# Altium footprint library Amirreza.PcbLib: 524 footprints (part 5 of 33)
Each footprint in its own frame and in the unit in brackets; x right, y up, seen from the top. Pads: shape width x height; smd on the part's side, far side on the other; paste and mask are expansions set on the pad; w line width, h text height; cw(c..) or ccw(c..) is an arc to the next point about the centre after c.
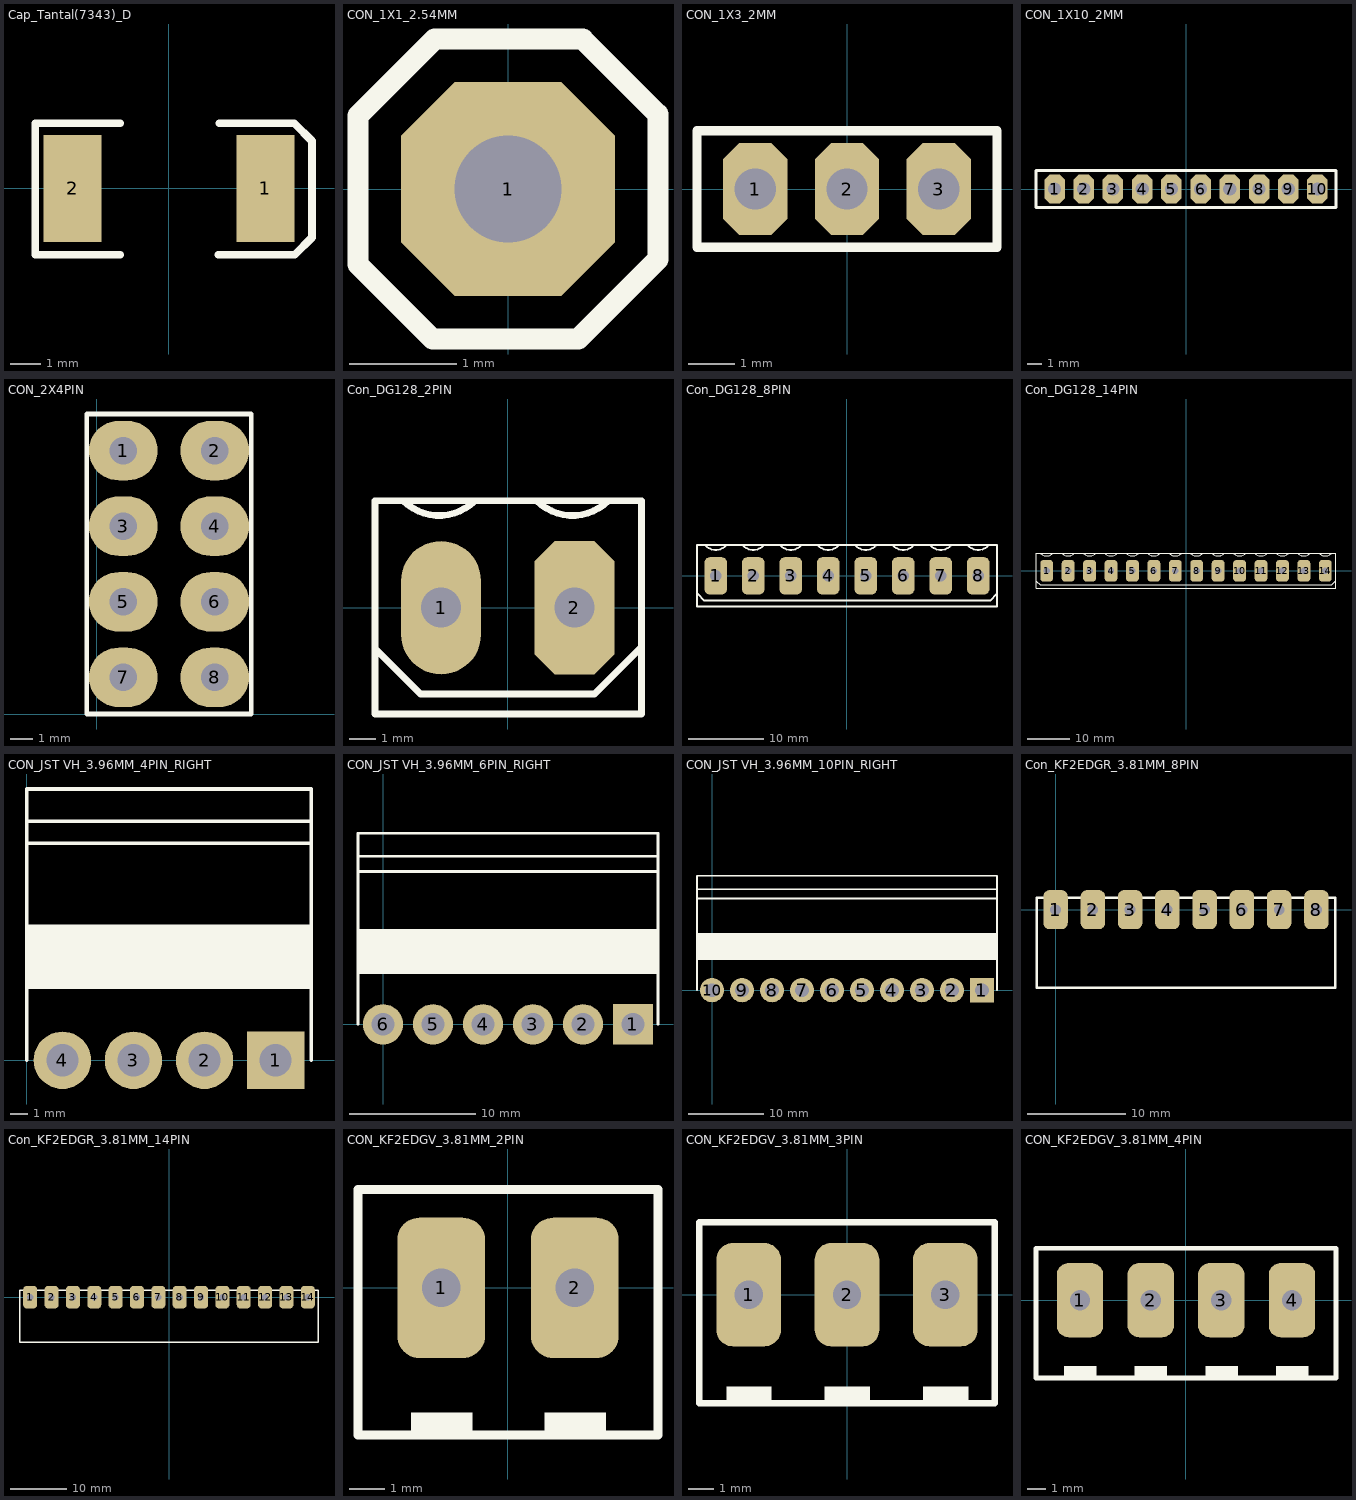
[diagram p4: the footprints below, top view; thin cyan lines are the x and y axes]

## Cap_Tantal(7343)_D [mm]
pads (2):
  rect 1.9x3.5 smd: 1(3.15,0) 2(-3.15,0)
Top Overlay:
  lines w0.254: -1.601,-2.166 -4.369,-2.166 -4.369,2.134 -1.601,2.134 ; 1.618,-2.166 4.107,-2.166 4.673,-1.6 4.673,1.549 4.089,2.134 1.651,2.134
3D body "User Library-AVX_E_CASE.step": height 4.2, standoff 0, extent -3.7,-2.225 3.7,2.225

## CON_1X1_2.54MM [mm]
pads (1):
  oct 2x2 hole 1: 1(0,0)
Top Overlay:
  lines w0.2: -1.4,-0.704 -1.4,0.685 -0.685,1.4 0.696,1.4 1.4,0.696 1.4,-0.656 0.656,-1.4 -0.704,-1.4 -1.4,-0.704
3D body "User Library-Header Vertical 2_54mm Pitch2-1.step": height 5.99, standoff -2.89, extent -1.27,-1.27 1.27,1.27

## CON_1X3_2MM [mm]
pads (3):
  oct 1.4x2 hole 0.9: 1(-2,0) 2(0,0) 3(2,0)
Top Overlay:
  lines w0.2: -3.27,-1.27 -3.27,1.27 -1.365,1.27 3.27,1.27 3.27,-1.27 -3.27,-1.27

## CON_1X10_2MM [mm]
pads (10):
  oct 1.4x2 hole 0.9: 1(-9,0) 2(-7,0) 3(-5,0) 4(-3,0) 5(-1,0) 6(1,0) 7(3,0) 8(5,0) 9(7,0) 10(9,0)
Top Overlay:
  lines w0.2: -10.27,-1.27 10.27,-1.27 10.27,1.27 -8.365,1.27 -10.27,1.27 -10.27,-1.27

## CON_2X4PIN [mm]
pads (8):
  oval 3x2.6 hole 1.2: 1(1.15,11.5) 2(5.15,11.5) 3(1.15,8.2) 4(5.15,8.2) 5(1.15,4.9) 6(5.15,4.9) 7(1.15,1.6) 8(5.15,1.6)
Top Overlay:
  lines w0.2: -0.45,13.075 -0.45,0 6.75,0 6.75,13.075 ; -0.45,13.1 6.75,13.1

## Con_DG128_2PIN [mm]
pads (2):
  oval 3x5 hole 1.5: 1(-2.5,0)
  oct 3x5 hole 1.5: 2(2.5,0)
Top Overlay:
  lines w0.254: -4.982,-1.532 -3.276,-3.238 3.25,-3.238 5.018,-1.469 ; -3.922,4.013 ccw(c-2.576,5.359) -1.23,4.013 ; 1.081,4.013 ccw(c2.428,5.359) 3.774,4.013 ; -4.982,-3.987 5.018,-3.987 5.018,4.013 -4.982,4.013 -4.982,-3.987

## Con_DG128_8PIN [mm]
pads (8):
  rrect50% 3x5 hole 1.5: 1(-17.5,0) 2(-12.5,0) 3(-7.5,0) 4(-2.5,0) 5(2.5,0) 6(7.5,0) 7(12.5,0) 8(17.5,0)
Top Overlay:
  lines w0.254: -19.913,-2.413 -19.024,-3.302 19.076,-3.302 19.965,-2.413 ; -18.846,4.013 ccw(c-17.5,5.359) -16.154,4.013 ; -13.846,4.013 ccw(c-12.5,5.359) -11.154,4.013 ; -8.846,4.013 ccw(c-7.5,5.359) -6.154,4.013 ; -3.846,4.013 ccw(c-2.5,5.359) -1.154,4.013 ; 1.154,4.013 ccw(c2.5,5.359) 3.846,4.013 ; 6.154,4.013 ccw(c7.5,5.359) 8.846,4.013 ; 11.154,4.013 ccw(c12.5,5.359) 13.846,4.013 ; 16.154,4.013 ccw(c17.5,5.359) 18.846,4.013 ; 20,-4.1 -20,-4.1 -20,4.1 20,4.1 ; 20.005,-4.1 20.005,4.1

## Con_DG128_14PIN [mm]
pads (14):
  rrect50% 3x5 hole 1.5: 1(-32.5,0) 2(-27.5,0) 3(-22.5,0) 4(-17.5,0) 5(-12.5,0) 6(-7.5,0) 7(-2.5,0) 8(2.5,0) 9(7.5,0) 10(12.5,0) 11(17.5,0) 12(22.5,0) 13(27.5,0) 14(32.5,0)
Top Overlay:
  lines w0.254: -34.913,-2.413 -34.024,-3.302 34.048,-3.302 35,-2.35 ; -33.846,4.013 ccw(c-32.5,5.359) -31.154,4.013 ; -28.846,4.013 ccw(c-27.5,5.359) -26.154,4.013 ; -23.846,4.013 ccw(c-22.5,5.359) -21.154,4.013 ; -18.846,4.013 ccw(c-17.5,5.359) -16.154,4.013 ; -13.846,4.013 ccw(c-12.5,5.359) -11.154,4.013 ; -8.846,4.013 ccw(c-7.5,5.359) -6.154,4.013 ; -3.846,4.013 ccw(c-2.5,5.359) -1.154,4.013 ; 1.154,4.013 ccw(c2.5,5.359) 3.846,4.013 ; 6.154,4.013 ccw(c7.5,5.359) 8.846,4.013 ; 11.154,4.013 ccw(c12.5,5.359) 13.846,4.013 ; 16.154,4.013 ccw(c17.5,5.359) 18.846,4.013 ; 21.154,4.013 ccw(c22.5,5.359) 23.846,4.013 ; 26.154,4.013 ccw(c27.5,5.359) 28.846,4.013 ; 31.154,4.013 ccw(c32.5,5.359) 33.846,4.013 ; -35,-4.1 -35,4.1 35,4.1 35,-4.1 -35,-4.1

## CON_JST VH_3.96MM_4PIN_RIGHT [mm] "3.96mm Wire to board connector (JST VH)Needle seat,90degree,High bend,4P"
pads (4):
  rect 3.2x3.2 / inner rect 3.2x3.2 / far side rect 3.2x5 hole 1.8: 1(13.86,0)
  round 3.2 / inner round 3.2 / far side rrect50% 3.2x5 hole 1.8: 2(9.9,0) 3(5.94,0) 4(1.98,0)
Top Overlay:
  rectangle: 0,4.07 15.84,7.47
  lines w0.203: 0,0 0,15.12 15.834,15.12 ; 0,4.07 15.834,4.07 ; 0,7.47 15.834,7.47 ; 0,12.105 15.84,12.105 ; 0,13.32 15.834,13.32 ; 15.84,0 15.84,15.12
3D body "X9396WR-04A-N0SN.stp": height 8.44, standoff -3, extent 0.015,-0.574 15.855,15.116

## CON_JST VH_3.96MM_6PIN_RIGHT [mm] "3.96mm Wire to board connector (JST VH)Needle seat,90degree,High bend,6P"
pads (6):
  rect 3.2x3.2 / inner rect 3.2x3.2 / far side rect 3.2x5 hole 1.8: 1(19.8,0)
  round 3.2 / inner round 3.2 / far side rrect50% 3.2x5 hole 1.8: 2(15.84,0) 3(11.88,0) 4(7.92,0) 5(3.96,0) 6(0,0)
Top Overlay:
  rectangle: -1.98,4.07 21.78,7.47
  lines w0.203: -1.98,0 -1.98,15.12 21.774,15.12 ; -1.98,4.07 21.774,4.07 ; -1.98,7.47 21.774,7.47 ; -1.98,12.105 21.78,12.105 ; -1.98,13.32 21.774,13.32 ; 21.78,0 21.78,15.12
3D body "X9396WR-06A-N0SN.stp": height 8.44, standoff -3, extent -1.965,-0.574 21.795,15.116

## CON_JST VH_3.96MM_10PIN_RIGHT [mm] "3.96mm Wire to board connector (JST VH)Needle seat,90degree,High bend,10P"
pads (10):
  rect 3.2x3.2 / inner rect 3.2x3.2 / far side rect 3.2x5 hole 1.8: 1(35.64,0)
  round 3.2 / inner round 3.2 / far side rrect50% 3.2x5 hole 1.8: 2(31.68,0) 3(27.72,0) 4(23.76,0) 5(19.8,0) 6(15.84,0) 7(11.88,0) 8(7.92,0) 9(3.96,0) 10(0,0)
Top Overlay:
  rectangle: -1.98,4.07 37.62,7.47
  lines w0.203: -1.98,0 -1.98,15.12 37.614,15.12 ; -1.98,4.07 37.614,4.07 ; -1.98,7.47 37.614,7.47 ; -1.98,13.32 37.614,13.32 ; -1.974,12.105 37.62,12.105 ; 37.62,0 37.62,15.12
3D body "X9396WR-10A-N0SN.stp": height 8.44, standoff -3, extent -1.965,-0.574 37.635,15.116

## Con_KF2EDGR_3.81MM_8PIN [mm]
pads (8):
  rrect50% 2.5x4 hole 1.1: 1(0,0) 2(3.81,0) 3(7.62,0) 4(11.43,0) 5(15.24,0) 6(19.05,0) 7(22.86,0) 8(26.67,0)
Top Overlay:
  lines w0.254: -1.905,-8 -1.905,1.194 -1.899,1.2 28.575,1.2 28.575,-8 -1.905,-8
3D body "User Library-KF2EDG-3_5-4P.step": height 7.25, standoff -3.65, extent 13.386,-7.901 28.386,1.399
3D body "User Library-KF2EDG-3_5-4P.step": height 7.25, standoff -3.65, extent -1.614,-7.901 13.386,1.399

## Con_KF2EDGR_3.81MM_14PIN [mm]
pads (14):
  rrect50% 2.5x4 hole 1.1: 1(-24.765,0) 2(-20.955,0) 3(-17.145,0) 4(-13.335,0) 5(-9.525,0) 6(-5.715,0) 7(-1.905,0) 8(1.905,0) 9(5.715,0) 10(9.525,0) 11(13.335,0) 12(17.145,0) 13(20.955,0) 14(24.765,0)
Top Overlay:
  lines w0.254: -26.67,-8 26.67,-8 26.67,1.2 -26.664,1.2 -26.67,1.194 -26.67,-8
3D body "User Library-KF2EDG-3_5-4P.step": height 7.25, standoff -3.65, extent -26.575,-7.903 -11.575,1.397
3D body "User Library-KF2EDG-3_5-4P.step": height 7.25, standoff -3.65, extent -11.335,-7.903 3.665,1.397
3D body "User Library-KF2EDG-3_5-4P.step": height 7.25, standoff -3.65, extent 4.159,-7.899 19.159,1.401
3D body "User Library-KF2EDG-3_5-4P.step": height 7.25, standoff -3.65, extent 11.118,-7.899 26.118,1.401

## CON_KF2EDGV_3.81MM_2PIN [mm]
pads (2):
  rrect50% 2.5x4 hole 1.1: 1(-1.905,0) 2(1.905,0)
Top Overlay:
  rectangle: -2.769,-4.293 -1.016,-3.556
  rectangle: 1.041,-4.293 2.794,-3.556
  lines w0.254: -4.274,-4.2 4.275,-4.2 4.275,2.8 -4.274,2.8 -4.274,-4.2
3D body "1827127.stp": height 21.8, standoff 2.7, extent -4.195,-5.978 4.215,4.422
3D body "691321300002.stp": height 9.25, standoff -3.45, extent -4.405,-4.386 4.405,2.814

## CON_KF2EDGV_3.81MM_3PIN [mm]
pads (3):
  rrect50% 2.5x4 hole 1.1: 1(-3.81,0) 2(0,0) 3(3.81,0)
Top Overlay:
  rectangle: -4.674,-4.293 -2.921,-3.556
  rectangle: -0.864,-4.293 0.889,-3.556
  rectangle: 2.946,-4.293 4.699,-3.556
  lines w0.254: -5.715,2.8 -5.715,-4.2 5.715,-4.2 5.715,2.8 -5.709,2.8
3D body "691321300003.stp": height 9.25, standoff -3.45, extent -6.31,-4.406 6.31,2.794
3D body "1827130.stp": height 21.8, standoff 2.7, extent -6.085,-6.133 6.135,4.267

## CON_KF2EDGV_3.81MM_4PIN [mm]
pads (4):
  rrect50% 2.5x4 hole 1.1: 1(-5.715,0) 2(-1.905,0) 3(1.905,0) 4(5.715,0)
Top Overlay:
  rectangle: -6.579,-4.293 -4.826,-3.556
  rectangle: -2.769,-4.293 -1.016,-3.556
  rectangle: 1.041,-4.293 2.794,-3.556
  rectangle: 4.851,-4.293 6.604,-3.556
  lines w0.254: -8.087,-4.2 8.087,-4.2 8.087,2.8 -8.087,2.8 -8.087,-4.2
3D body "691321300004.stp": height 9.25, standoff -3.45, extent -8.215,-4.386 8.215,2.814
3D body "1827143.stp": height 21.8, standoff 2.7, extent -8.015,-6.158 8.015,4.242